# Altium footprint library lib_protel_HC.PCBLIB: 724 footprints (part 15 of 46)
Each footprint in its own frame and in the unit in brackets; x right, y up, seen from the top. Pads: shape width x height; smd on the part's side, far side on the other; paste and mask are expansions set on the pad; w line width, h text height; cw(c..) or ccw(c..) is an arc to the next point about the centre after c.
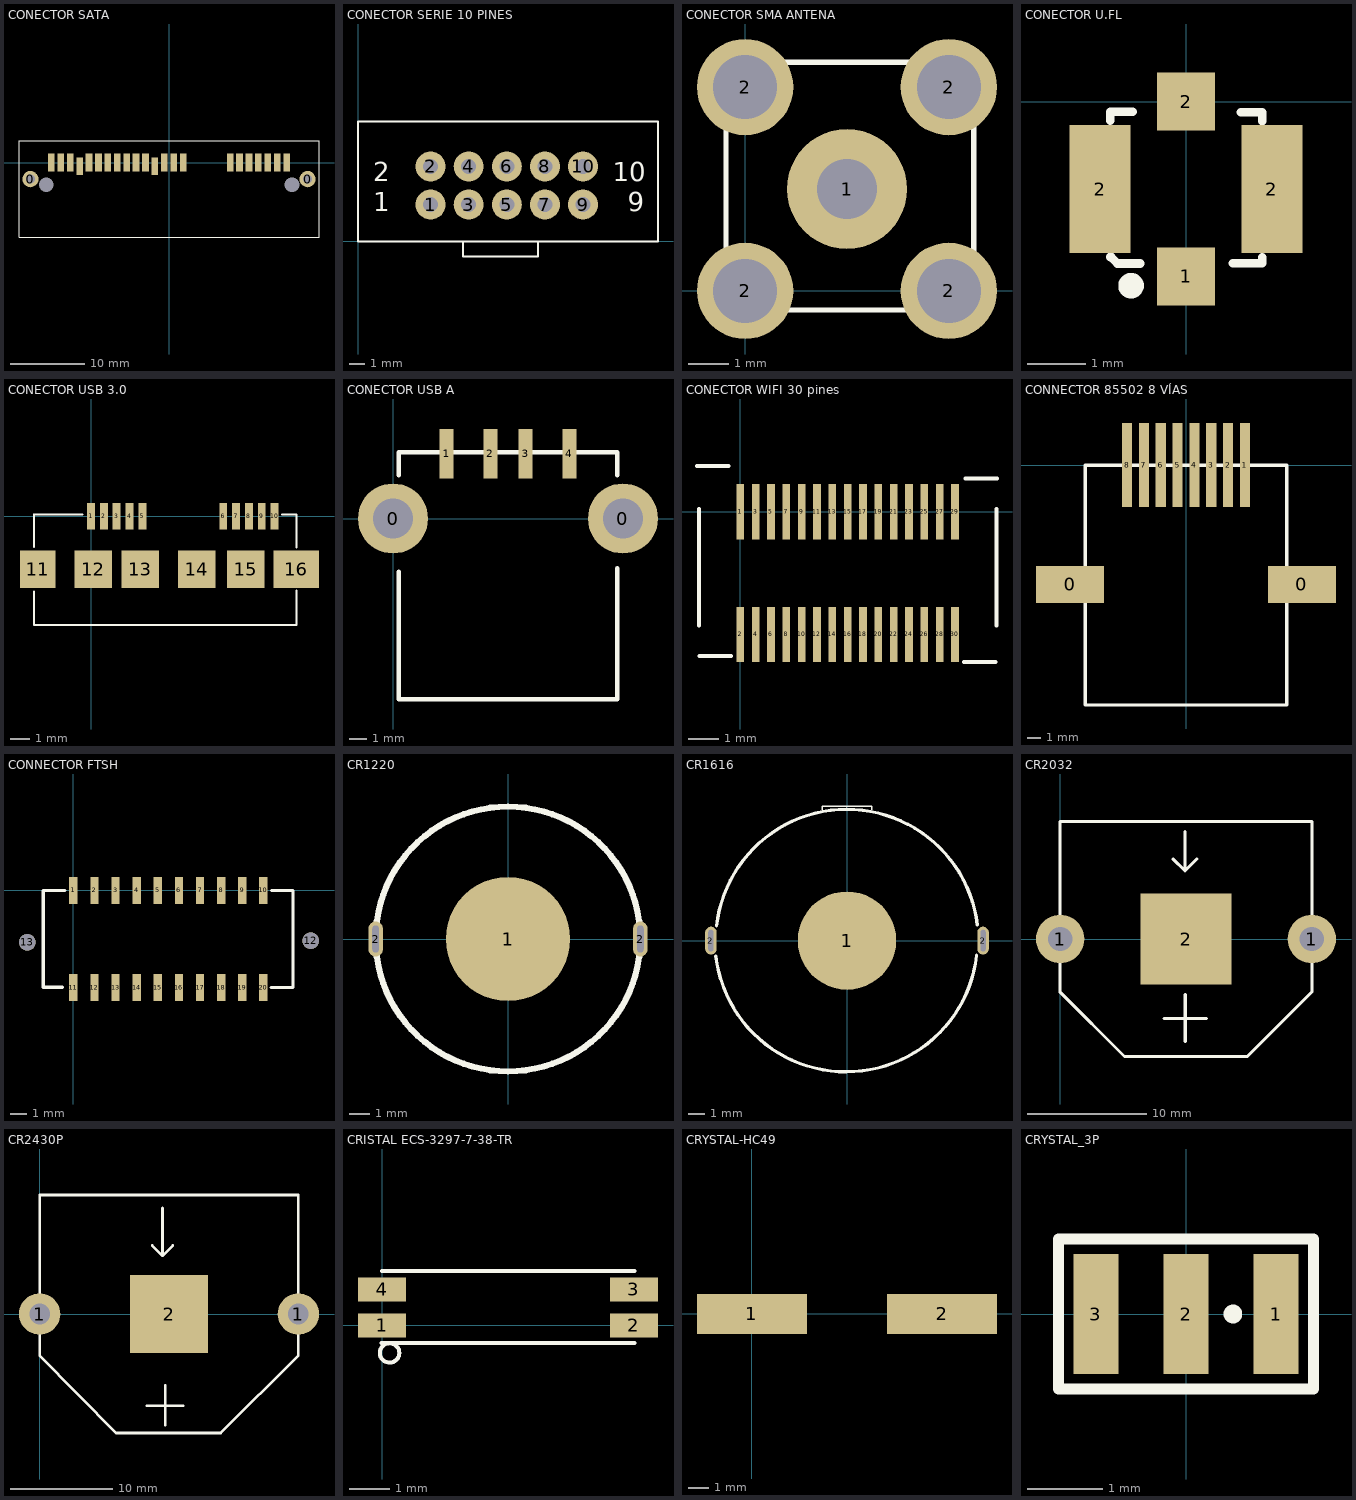
[diagram p14: the footprints below, top view; thin cyan lines are the x and y axes]

## CONECTOR SATA [mm] "CONECTOR DATOS+ALIMENT SATA"
height 6.74
pads (26):
  round 2.2 hole 1.2: 0(-18.71,-2.24) 0(18.71,-2.24)
  round 0 hole 2: 0(-16.565,-3) 0(16.595,-3)
  rect 0.9x2.4 smd: P1(1.905,0) P2(0.635,0) P3(-0.635,0) P4(-1.905,-0.5) P5(-3.175,0) P6(-4.445,0) P7(-5.715,0) P8(-6.985,0) P9(-8.255,0) P10(-9.525,0) P11(-10.795,0) P12(-12.065,-0.5) P13(-13.335,0) P14(-14.605,0) P15(-15.875,0) S1(15.875,0) S2(14.605,0) S3(13.335,0) S4(12.065,0) S5(10.795,0) S6(9.525,0) S7(8.255,0)
Top Overlay:
  lines w0.1: -20.25,-10.075 20.25,-10.075 20.25,2.925 -20.25,2.925 -20.25,-10.075

## CONECTOR SERIE 10 PINES [mm]
pads (10):
  round 2 hole 1: 1(4.84,2.46) 2(4.84,5) 3(7.38,2.46) 4(7.38,5) 5(9.92,2.46) 6(9.92,5) 7(12.46,2.46) 8(12.46,5) 9(15,2.46) 10(15,5)
Top Overlay:
  lines w0.127: 7,0 7,-1 12,-1 12,0 ; 0,0 20,0 20,8 0,8 0,0
  text "1" at 1,2 h1.27
  text "9" at 18,2 h1.27
  text "2" at 1,4 h1.27
  text "10" at 17,4 h1.27

## CONECTOR SMA ANTENA [mm] "conector sma para antena en angulo recto."
height 11
pads (5):
  round 3 hole 1.5: 1(2.54,2.54)
  round 2.4 hole 1.6: 2(0,0) 2(0,5.08) 2(5.08,5.08)
  round 2.4 hole 1.6 paste+0: 2(5.08,0)
Top Overlay:
  lines w0.127: -0.48,-0.48 5.7,-0.48 5.7,5.7 -0.48,5.7 -0.48,-0.48

## CONECTOR U.FL [mm] "CONECTOR ANTENA U.FL"
height 1.3
pads (4):
  rect 1x1 smd: 1(0,-3) 2(0,0)
  rect 1.05x2.2 smd: 2(-1.475,-1.5) 2(1.475,-1.5)
Top Overlay:
  circle w0.254: c-0.943,-3.16 r0.093
  lines w0.15: -1.299,-0.327 -1.299,-0.178 -1.294,-0.173 -0.919,-0.173 ; -1.295,-2.667 -1.287,-2.667 -1.175,-2.779 -0.787,-2.779 ; 0.808,-2.776 1.307,-2.776 1.307,-2.673 ; 0.945,-0.183 1.308,-0.183 ; 1.308,-0.335 1.308,-0.183 ; 1.308,-0.183 1.308,-0.183
3D body "User Library-0734120110 - Molex - UMC Antenna Connector SMT.step": height 1.3, standoff 0, extent -1.5,-3.05 1.5,0.05

## CONECTOR USB 3.0 [mm] "USB 3.0 GSB343133HR"
height 2.8
pads (16):
  rect 0.4x1.35 smd: 1(0,0) 2(0.65,0) 3(1.3,0) 4(1.95,0) 5(2.6,0) 6(6.7,0) 7(7.35,0) 8(8,0) 9(8.65,0) 10(9.3,0)
  rect 1.8x1.9 smd: 11(-2.7,-2.675)
  rect 1.9x1.9 smd: 12(0.1,-2.675) 13(2.5,-2.675) 14(5.35,-2.675) 15(7.85,-2.675)
  rect 2.3x1.9 smd: 16(10.4,-2.675)
Top Overlay:
  lines w0.1: -2.9,-3.8 -2.9,-5.5 10.4,-5.5 10.4,-3.75 ; -2.9,-1.55 -2.9,0.1 ; -0.425,0.1 -2.9,0.1 ; 9.675,0.1 10.4,0.1 ; 10.4,-1.575 10.4,0.1 ; -2.9,0.1 -2.9,0.1 ; 10.4,0.1 10.4,0.1

## CONECTOR USB A [mm] "CONECTOR USB TIPO A"
height 7
pads (6):
  round 4 hole 2.3: 0(0,0) 0(13.14,0)
  rect 0.8x2.82 smd: 1(3.07,3.71) 2(5.57,3.71) 3(7.57,3.71) 4(10.07,3.71)
Top Overlay:
  lines w0.254: 0.32,-3.05 0.32,-10.315 12.82,-10.315 12.82,-2.85 ; 0.32,2.475 0.32,3.785 12.82,3.785 12.82,2.475

## CONECTOR WIFI 30 pines [mm] "microconector wifi"
height 2.27
pads (30):
  rect 0.25x1.8 smd mask+0.102: 1(0,0) 2(0,-4) 3(0.5,0) 4(0.5,-4) 5(1,0) 6(1,-4) 7(1.5,0) 8(1.5,-4) 9(2,0) 10(2,-4) 11(2.5,0) 12(2.5,-4) 13(3,0) 14(3,-4) 15(3.5,0) 16(3.5,-4) 17(4,0) 18(4,-4) 19(4.5,0) 20(4.5,-4) 21(5,0) 22(5,-4) 23(5.5,0) 24(5.5,-4) 25(6,0) 26(6,-4) 27(6.5,0) 28(6.5,-4) 29(7,0) 30(7,-4)
Top Overlay:
  lines w0.127: -1.411,1.499 -0.381,1.499 ; -1.35,-3.71 -1.35,0.09 ; -1.335,-4.699 -0.305,-4.699 ; 7.29,-4.902 8.32,-4.902 ; 7.341,1.092 8.371,1.092 ; 8.36,-3.71 8.36,0.09

## CONNECTOR 85502 8 VÍAS [mm] "CONNECTOR MOLES 85502 8 VÍAS"
height 11.5
pads (10):
  rect 5.15x2.8 smd mask+0.1: 0(-8.75,-9.005) 0(8.75,-9.005)
  rect 0.76x6.35 smd mask+0.1: 1(4.445,0) 2(3.175,0) 3(1.905,0) 4(0.635,0) 5(-0.635,0) 6(-1.905,0) 7(-3.175,0) 8(-4.445,0)
Top Overlay:
  lines w0.254: -7.62,-18.11 -7.62,0 7.62,0 7.62,-18.11 -7.62,-18.11

## CONNECTOR FTSH [mm] "CONNECTOR FTSH-110-01-L-DV"
height 6
pads (22):
  rect 0.5x1.6 smd: 1(0,0) 2(1.27,0) 3(2.54,0) 4(3.81,0) 5(5.08,0) 6(6.35,0) 7(7.62,0) 8(8.89,0) 9(10.16,0) 10(11.43,0) 11(0,-5.84) 12(1.27,-5.84) 13(2.54,-5.84) 14(3.81,-5.84) 15(5.08,-5.84) 16(6.35,-5.84) 17(7.62,-5.84) 18(8.89,-5.84) 19(10.16,-5.84) 20(11.43,-5.84)
  round 1 hole 1: 12(14.275,-3.023) 13(-2.769,-3.124)
Top Overlay:
  lines w0.2: -0.66,-5.817 -1.829,-5.817 -1.803,-5.791 -1.803,0 -0.508,0 ; 11.913,-5.842 13.208,-5.842 13.208,0 11.938,0

## CR1220 [mm] "WJ-CR1220-1"
pads (3):
  round 6 smd mask+0: 1(0,0)
  oval 0.7x1.7 hole 0.3 slot 1.3 at 90 deg mask+0: 2(-6.4,0) 2(6.4,0)
Top Overlay:
  circle w0.3: c0,0 r6.4

## CR1616 [mm] "WJ-CR1616-1"
pads (3):
  round 6 smd mask+0: 1(0,0)
  oval 0.7x1.7 hole 0.3 slot 1.3 at 90 deg mask+0: 2(-8.3,0) 2(8.3,0)
Top Overlay:
  lines w0.1: -1.5,8 -1.5,8.2 -1.475,8.2 0,8.2 1.5,8.2 1.5,7.975
  lines w0.2: -8,-0.95 ccw(c-0.05,0) 7.906,-0.901 ; -7.956,0.901 cw(c0,0) 7.95,0.95

## CR2032 [mil] "PORTAPILA BOTÓN CR2032"
height 144.88
pads (3):
  round 160 hole 80: 1(0,0) 1(831,0)
  rect 300x300 smd: 2(415.5,0)
Top Overlay:
  lines w10: 0,-160 0,0 0,388 831,388 831,0 831,-160 831,-175 618,-388 213,-388 212,-388 0,-176 0,-158 ; 343,-263 413,-263 483,-263 ; 372,265 412,225 ; 412,355 412,225 ; 413,-338 413,-183 ; 452,265 412,225

## CR2430P [mil] "PORTAPILA BOTÓN"
height 157.48
pads (3):
  round 160 hole 80: 1(0,0) 1(1000,0)
  rect 300x300 smd: 2(500,0)
Top Overlay:
  lines w10: 415,-355 485,-355 555,-355 ; 435,265 475,225 ; 475,410 475,225 ; 485,-430 485,-275 ; 515,265 475,225 ; 0,-160 0,0 0,460 1000,460 1000,0 1000,-160 700,-460 295,-460 0,-160

## CRISTAL ECS-3297-7-38-TR [mm] "RELOJ 32.768 KHZ"
height 1.4
pads (4):
  rect 1.2x0.6 smd: 1(0,0) 2(6.3,0) 3(6.3,0.9) 4(0,0.9)
Top Overlay:
  circle w0.1: c0.19,-0.69 r0.244
  lines w0.1: -0.01,-0.44 6.31,-0.44 ; 0,1.36 6.31,1.36

## CRYSTAL-HC49 [mm] "CRYSTAL"
height 4.3
pads (2):
  rect 5.5x2 smd: 1(0,0) 2(9.5,0)

## CRYSTAL_3P [mm]
height 0.9
pads (3):
  rect 0.6x1.6 smd: 1(1.2,0) 2(0,0) 3(-1.2,0)
Top Overlay:
  circle w0.15: c0.625,0 r0.05
  lines w0.15: -1.7,-1 -1.7,1 1.7,1 1.7,-1 -1.7,-1
3D body "User Library-CSTCE.step": height 0.7, standoff 0, extent -1.6,-0.65 1.6,0.65